# Altium footprint library Cyber_VCM.PcbLib: 39 footprints (part 3 of 3)
Each footprint in its own frame and in the unit in brackets; x right, y up, seen from the top. Pads: shape width x height; smd on the part's side, far side on the other; paste and mask are expansions set on the pad; w line width, h text height; cw(c..) or ccw(c..) is an arc to the next point about the centre after c.
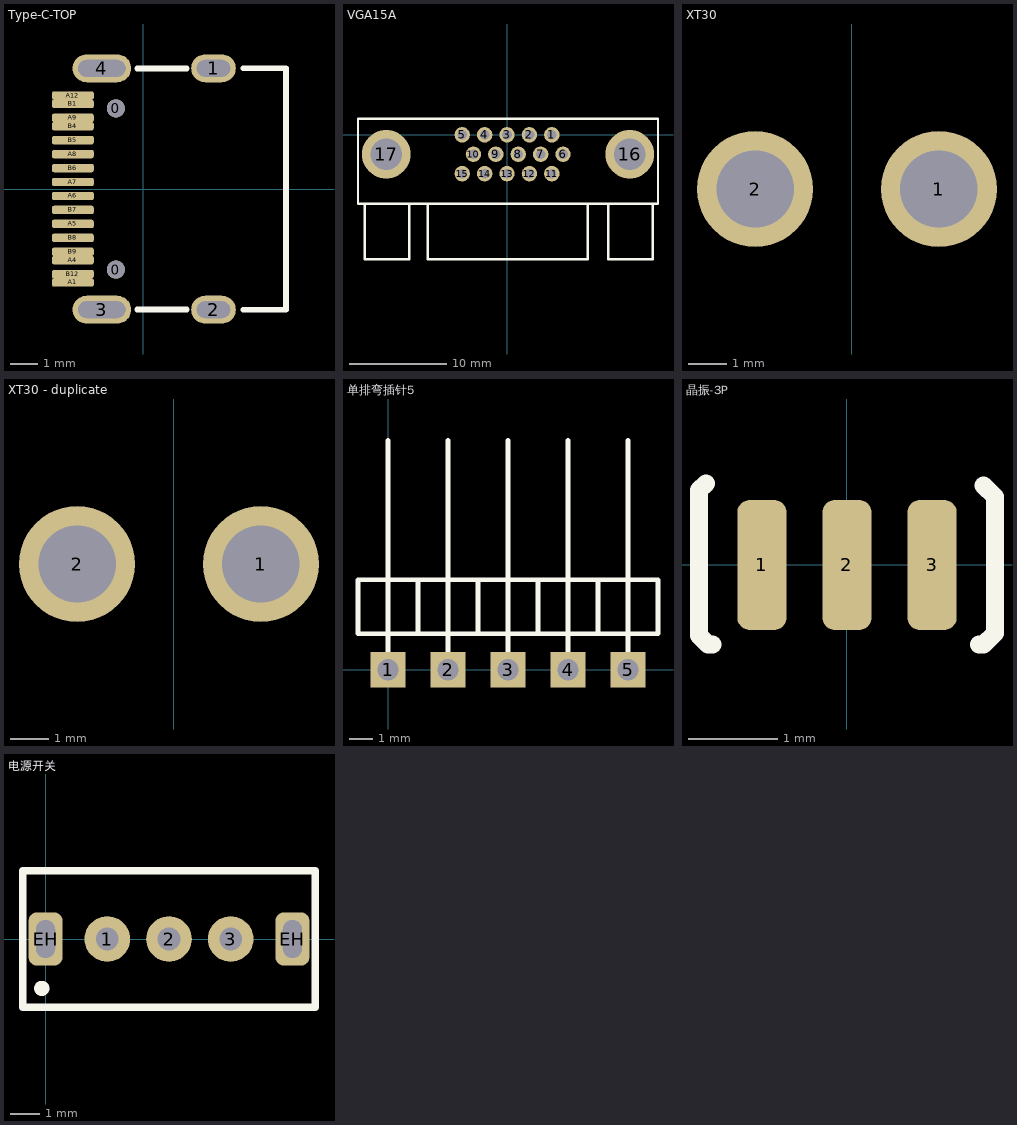
[diagram p2: the footprints below, top view; thin cyan lines are the x and y axes]

## Type-C-TOP [mm]
height 4.3
pads (22):
  round 0.65 hole 0.65: 0(-0.98,-2.89) 0(-0.98,2.89)
  oval 1.6x1 hole 0.6 slot 1.2 at 0 deg: 1(2.52,4.325) 2(2.52,-4.325)
  oval 2.1x1 hole 0.6 slot 1.7 at 0 deg: 3(-1.48,-4.325) 4(-1.48,4.325)
  rrect50% 1.5x0.3 smd: A1(-2.52,-3.35) A4(-2.52,-2.55) A5(-2.52,-1.25) A6(-2.52,-0.25) A7(-2.52,0.25) A8(-2.52,1.25) A9(-2.52,2.55) A12(-2.52,3.35) B1(-2.52,3.05) B4(-2.52,2.25) B5(-2.52,1.75) B6(-2.52,0.75) B7(-2.52,-0.75) B8(-2.52,-1.75) B9(-2.52,-2.25) B12(-2.52,-3.05)
Top Overlay:
  lines w0.203: -0.218,-4.318 1.56,-4.318 ; -0.218,4.318 1.56,4.318 ; 3.592,-4.325 5.12,-4.325 5.12,4.325 3.592,4.325
3D body "1.step": height 3.26, standoff -1, extent -2.568,-4.475 5.182,4.475

## VGA15A [mm] "15针通讯接口"
pads (17):
  round 1.58 hole 1: 1(4.6,0) 2(2.3,0) 3(0,0) 4(-2.3,0) 5(-4.6,0) 6(5.75,-1.992) 7(3.45,-1.992) 8(1.15,-1.992) 9(-1.15,-1.992) 10(-3.45,-1.992) 11(4.6,-3.984) 12(2.3,-3.984) 13(0,-3.984) 14(-2.3,-3.984) 15(-4.6,-3.984)
  round 5 hole 3.25: 16(12.6,-1.992) 17(-12.4,-1.992)
Top Overlay:
  lines w0.254: -14.605,-7.087 -14.605,-12.751 -10.025,-12.751 -10.025,-7.087 ; -8.125,-7.061 -8.125,-12.751 8.275,-12.751 8.275,-7.137 ; 10.405,-7.061 10.405,-12.751 14.975,-12.751 14.975,-7.061 ; -15.3,-7.061 15.5,-7.061 15.5,1.629 -15.3,1.629 -15.3,-7.061
Mechanical 15:
  circle w0.05: c0,0 r0.35
  lines w0.05: -0.5,0 0.5,0 ; 0,-0.5 0,0.5
3D body "User Library-SLIM D-SUB RIGHT ANGLE PCB MOUNT.step": height 10.75, standoff -2.59, extent -15.397,-12.395 15.403,1.075

## XT30 [mil]
pads (2):
  round 120 hole 80: 1(90,240) 2(-100,240)
via -220,-150 diameter 50 hole 45
via 210,-150 diameter 50 hole 45
3D body "User Library-XT30PW-M.STEP": height 196.85, standoff -78.74, extent -266.81,-267.16 256.81,282.05

## XT30 - duplicate [mil]
pads (2):
  round 120 hole 80: 1(90,240) 2(-100,240)
via -220,-150 diameter 50 hole 45
via 210,-150 diameter 50 hole 45
3D body "User Library-XT30PW-M.STEP": height 196.85, standoff -78.74, extent -266.81,-267.16 256.81,282.05

## 单排弯插针5 [mm]
pads (5):
  rect 1.5x1.5 hole 0.9: 1(0,0) 2(2.54,0) 3(5.08,0) 4(7.62,0) 5(10.16,0)
Top Overlay:
  lines w0.203: 0,0.025 0,9.708 ; 2.54,0.025 2.54,9.708 ; 5.08,0.025 5.08,9.708 ; 7.62,0.025 7.62,9.708 ; 10.16,0.025 10.16,9.708 ; 1.27,1.524 1.27,3.81 ; 1.27,1.524 -1.27,1.524 -1.27,3.81 1.27,3.81 ; 1.27,1.524 3.81,1.524 ; 1.27,3.81 3.81,3.81 ; 3.81,1.524 3.81,3.81 ; 3.81,1.524 6.35,1.524 ; 3.81,3.81 6.35,3.81 ; 6.35,1.524 6.35,3.81 ; 6.35,1.524 8.89,1.524 ; 6.35,3.81 8.89,3.81 ; 8.89,1.524 8.89,3.81 ; 8.89,1.524 11.43,1.524 11.43,3.81 8.89,3.81
3D body "User Library-Header_Male_RA_Low_1Pin.STEP": height 2.51, standoff -3, extent -1.27,-0.32 1.27,9.81
3D body "User Library-Header_Male_RA_Low_1Pin.STEP": height 2.51, standoff -3, extent 1.27,-0.32 3.81,9.81
3D body "User Library-Header_Male_RA_Low_1Pin.STEP": height 2.51, standoff -3, extent 3.81,-0.32 6.35,9.81
3D body "User Library-Header_Male_RA_Low_1Pin.STEP": height 2.51, standoff -3, extent 6.35,-0.32 8.89,9.81
3D body "User Library-Header_Male_RA_Low_1Pin.STEP": height 2.51, standoff -3, extent 8.89,-0.32 11.43,9.81

## 晶振-3P [mm] "贴片晶振"
height 4.3
pads (3):
  rrect50% 0.55x1.45 smd: 1(-0.95,0) 2(0,0) 3(0.95,0)
Top Overlay:
  lines w0.2: -1.576,0.911 -1.651,0.836 -1.651,-0.789 -1.551,-0.889 -1.501,-0.889 ; 1.474,-0.889 1.524,-0.889 1.651,-0.762 1.651,0.762 1.524,0.889
3D body "123123123.stp": height 0.7, standoff 0, extent -1.6,-0.65 1.6,0.65
3D body: height 0, standoff 0, extent 1.474,-0.89 1.652,0.89
3D body: height 0, standoff 0, extent 1.474,-0.89 1.652,0.89

## 电源开关 [mil]
pads (5):
  round 60 hole 30: 1(81.25,0) 2(162.5,0) 3(243.75,0)
  rrect50% 45x70 hole 50 slot 25 at 0 deg: EH(0,0) EH(325,0)
Top Overlay:
  circle w10: c-5,-65 r5
  lines w10: -30,-90 -30,90 355,90 355,-90 -30,-90
3D body "User Library-MiniSwitch-2.STEP": height 342.52, standoff -110.24, extent -6.79,-88.58 331.8,88.59